# Altium footprint library BASIC.PcbLib: 244 footprints (part 1 of 16)
Each footprint in its own frame and in the unit in brackets; x right, y up, seen from the top. Pads: shape width x height; smd on the part's side, far side on the other; paste and mask are expansions set on the pad; w line width, h text height; cw(c..) or ccw(c..) is an arc to the next point about the centre after c.
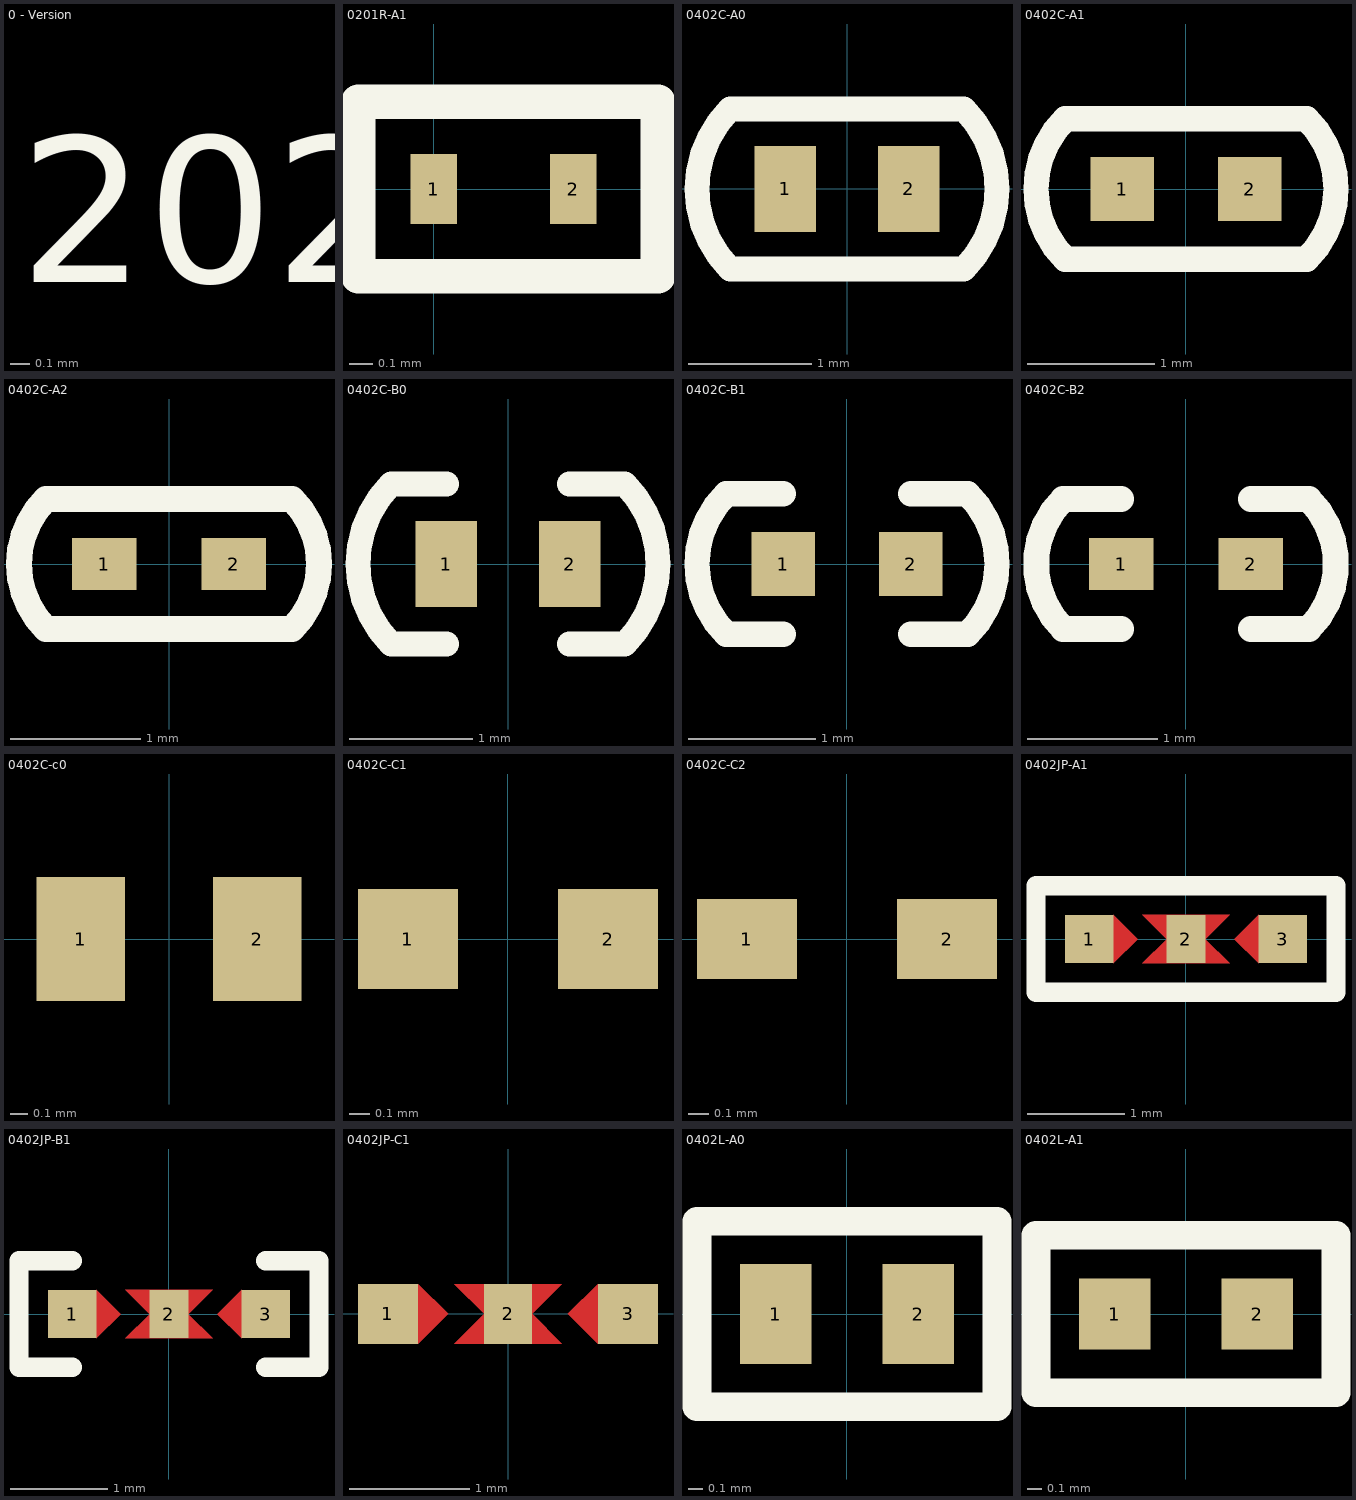
[diagram p0: the footprints below, top view; thin cyan lines are the x and y axes]

## 0 - Version [mm]
Top Overlay:
  text "BASIC / v1.0.2 / 2021/04/12" at -1269.375,-1269.45 h1.52

## 0201R-A1 [mm]
pads (2):
  rect 0.2x0.3 smd: 1(0,0) 2(0.6,0)
Top Overlay:
  lines w0.15: -0.325,-0.375 -0.325,0.375 0.96,0.375 ; -0.32,-0.375 0.965,-0.375 0.965,0.375
3D body "RES0201.step": height 0.15, standoff 0, extent 0,-0.15 0.6,0.15

## 0402C-A0 [mm]
pads (2):
  rect 0.5x0.7 smd: 1(-0.5,0) 2(0.5,0)
Top Overlay:
  lines w0.2: -0.95,-0.65 cw(c-0.3,0) -0.95,0.65 0.95,0.65 cw(c0.3,0) 0.95,-0.65 -0.95,-0.65
3D body "CAP0402-1.step": height 0.5, standoff 0, extent -0.499,-0.251 0.501,0.249

## 0402C-A1 [mm]
pads (2):
  rect 0.5x0.5 smd: 1(-0.5,0) 2(0.5,0)
Top Overlay:
  lines w0.2: -0.95,-0.55 cw(c-0.4,0) -0.95,0.55 0.95,0.55 cw(c0.4,0) 0.95,-0.55 -0.95,-0.55
3D body "CAP0402-1.step": height 0.5, standoff 0, extent -0.499,-0.251 0.501,0.249

## 0402C-A2 [mm]
pads (2):
  rect 0.5x0.4 smd: 1(-0.5,0) 2(0.5,0)
Top Overlay:
  lines w0.2: -0.95,-0.5 cw(c-0.45,0) -0.95,0.5 0.95,0.5 cw(c0.45,0) 0.95,-0.5 -0.95,-0.5
3D body "CAP0402-1.step": height 0.5, standoff 0, extent -0.499,-0.251 0.501,0.249

## 0402C-B0 [mm]
pads (2):
  rect 0.5x0.7 smd: 1(-0.5,0) 2(0.5,0)
Top Overlay:
  lines w0.2: -0.5,-0.65 -0.95,-0.65 cw(c-0.3,0) -0.95,0.65 -0.5,0.65 ; 0.5,-0.65 0.95,-0.65 ccw(c0.3,0) 0.95,0.65 0.5,0.65
3D body "CAP0402-1.step": height 0.5, standoff 0, extent -0.499,-0.251 0.501,0.249

## 0402C-B1 [mm]
pads (2):
  rect 0.5x0.5 smd: 1(-0.5,0) 2(0.5,0)
Top Overlay:
  lines w0.2: -0.5,-0.55 -0.95,-0.55 cw(c-0.4,0) -0.95,0.55 -0.5,0.55 ; 0.5,-0.55 0.95,-0.55 ccw(c0.4,0) 0.95,0.55 0.5,0.55
3D body "CAP0402-1.step": height 0.5, standoff 0, extent -0.499,-0.251 0.501,0.249

## 0402C-B2 [mm]
pads (2):
  rect 0.5x0.4 smd: 1(-0.5,0) 2(0.5,0)
Top Overlay:
  lines w0.2: -0.5,-0.5 -0.95,-0.5 cw(c-0.45,0) -0.95,0.5 -0.5,0.5 ; 0.5,-0.5 0.95,-0.5 ccw(c0.45,0) 0.95,0.5 0.5,0.5
3D body "CAP0402-1.step": height 0.5, standoff 0, extent -0.499,-0.251 0.501,0.249

## 0402C-c0 [mm]
pads (2):
  rect 0.5x0.7 smd: 1(-0.5,0) 2(0.5,0)
3D body "CAP0402-1.step": height 0.5, standoff 0, extent -0.499,-0.251 0.501,0.249

## 0402C-C1 [mm]
pads (2):
  rect 0.5x0.5 smd: 1(-0.5,0) 2(0.5,0)
3D body "CAP0402-1.step": height 0.5, standoff 0, extent -0.499,-0.251 0.501,0.249

## 0402C-C2 [mm]
pads (2):
  rect 0.5x0.4 smd: 1(-0.5,0) 2(0.5,0)
3D body "CAP0402-1.step": height 0.5, standoff 0, extent -0.499,-0.251 0.501,0.249

## 0402JP-A1 [mm]
pads (3):
  rect 0.5x0.5 smd: 1(-1,0) 3(1,0)
  rect 0.4x0.5 smd: 2(0,0)
Top Layer:
  region: 0.75,-0.25 0.5,0 0.75,0.25
  region: -0.25,0.25
  region: 0.45,0.25 0.2,0 0.45,-0.25 -0.45,-0.25 -0.2,0 -0.45,0.25
  region: -0.75,0.25 -0.5,0 -0.75,-0.25
Top Overlay:
  lines w0.2: 1.55,-0.55 -1.55,-0.55 -1.55,0.55 1.55,0.55 ; 1.55,-0.55 1.55,0.55
Top Solder:
  region: 0.55,0.35 0.55,0.25 0.3,0 0.55,-0.25 0.55,-0.35 -0.55,-0.35 -0.55,-0.25 -0.3,0 -0.55,0.25 -0.55,0.35
  region: -0.75,0.35 -0.4,0 -0.75,-0.35
  region: 0.75,-0.35 0.4,0 0.75,0.35
3D body "RES0402.step": height 0.35, standoff 0, extent -1,-0.25 0,0.25

## 0402JP-B1 [mm]
pads (3):
  rect 0.5x0.5 smd: 1(-1,0) 3(1,0)
  rect 0.4x0.5 smd: 2(0,0)
Top Layer:
  region: 0.75,-0.25 0.5,0 0.75,0.25
  region: -0.25,0.25
  region: 0.45,0.25 0.2,0 0.45,-0.25 -0.45,-0.25 -0.2,0 -0.45,0.25
  region: -0.75,0.25 -0.5,0 -0.75,-0.25
Top Overlay:
  lines w0.2: -1.55,-0.55 -1,-0.55 ; -1.55,0.55 -1,0.55 ; -1.55,-0.55 -1.55,0.55 ; 1,-0.55 1.55,-0.55 1.55,0.55 1,0.55
Top Solder:
  region: 0.55,0.35 0.55,0.25 0.3,0 0.55,-0.25 0.55,-0.35 -0.55,-0.35 -0.55,-0.25 -0.3,0 -0.55,0.25 -0.55,0.35
  region: -0.75,0.35 -0.4,0 -0.75,-0.35
  region: 0.75,-0.35 0.4,0 0.75,0.35
3D body "RES0402.step": height 0.35, standoff 0, extent -1,-0.25 0,0.25

## 0402JP-C1 [mm]
pads (3):
  rect 0.5x0.5 smd: 1(-1,0) 3(1,0)
  rect 0.4x0.5 smd: 2(0,0)
Top Layer:
  region: -0.75,0.25 -0.5,0 -0.75,-0.25
  region: 0.45,0.25 0.2,0 0.45,-0.25 -0.45,-0.25 -0.2,0 -0.45,0.25
  region: -0.25,0.25
  region: 0.75,-0.25 0.5,0 0.75,0.25
Top Solder:
  region: 0.75,-0.35 0.4,0 0.75,0.35
  region: -0.75,0.35 -0.4,0 -0.75,-0.35
  region: 0.55,0.35 0.55,0.25 0.3,0 0.55,-0.25 0.55,-0.35 -0.55,-0.35 -0.55,-0.25 -0.3,0 -0.55,0.25 -0.55,0.35
3D body "RES0402.step": height 0.35, standoff 0, extent -1,-0.25 0,0.25

## 0402L-A0 [mm]
pads (2):
  rect 0.5x0.7 smd: 1(-0.5,0) 2(0.5,0)
Top Overlay:
  lines w0.2: -1.05,-0.65 -1.05,0.65 1.05,0.65 1.05,-0.65 -1.05,-0.65
3D body "0402L.stp": height 0.26, standoff -0.24, extent -0.5,-0.275 0.5,0.275

## 0402L-A1 [mm]
pads (2):
  rect 0.5x0.5 smd: 1(-0.5,0) 2(0.5,0)
Top Overlay:
  lines w0.2: -1.05,-0.55 -1.05,0.55 1.05,0.55 1.05,-0.55 -1.05,-0.55
3D body "0402L.stp": height 0.26, standoff -0.24, extent -0.5,-0.275 0.5,0.275